# Altium footprint library 总库.PcbLib: 264 footprints (part 3 of 17)
Each footprint in its own frame and in the unit in brackets; x right, y up, seen from the top. Pads: shape width x height; smd on the part's side, far side on the other; paste and mask are expansions set on the pad; w line width, h text height; cw(c..) or ccw(c..) is an arc to the next point about the centre after c.
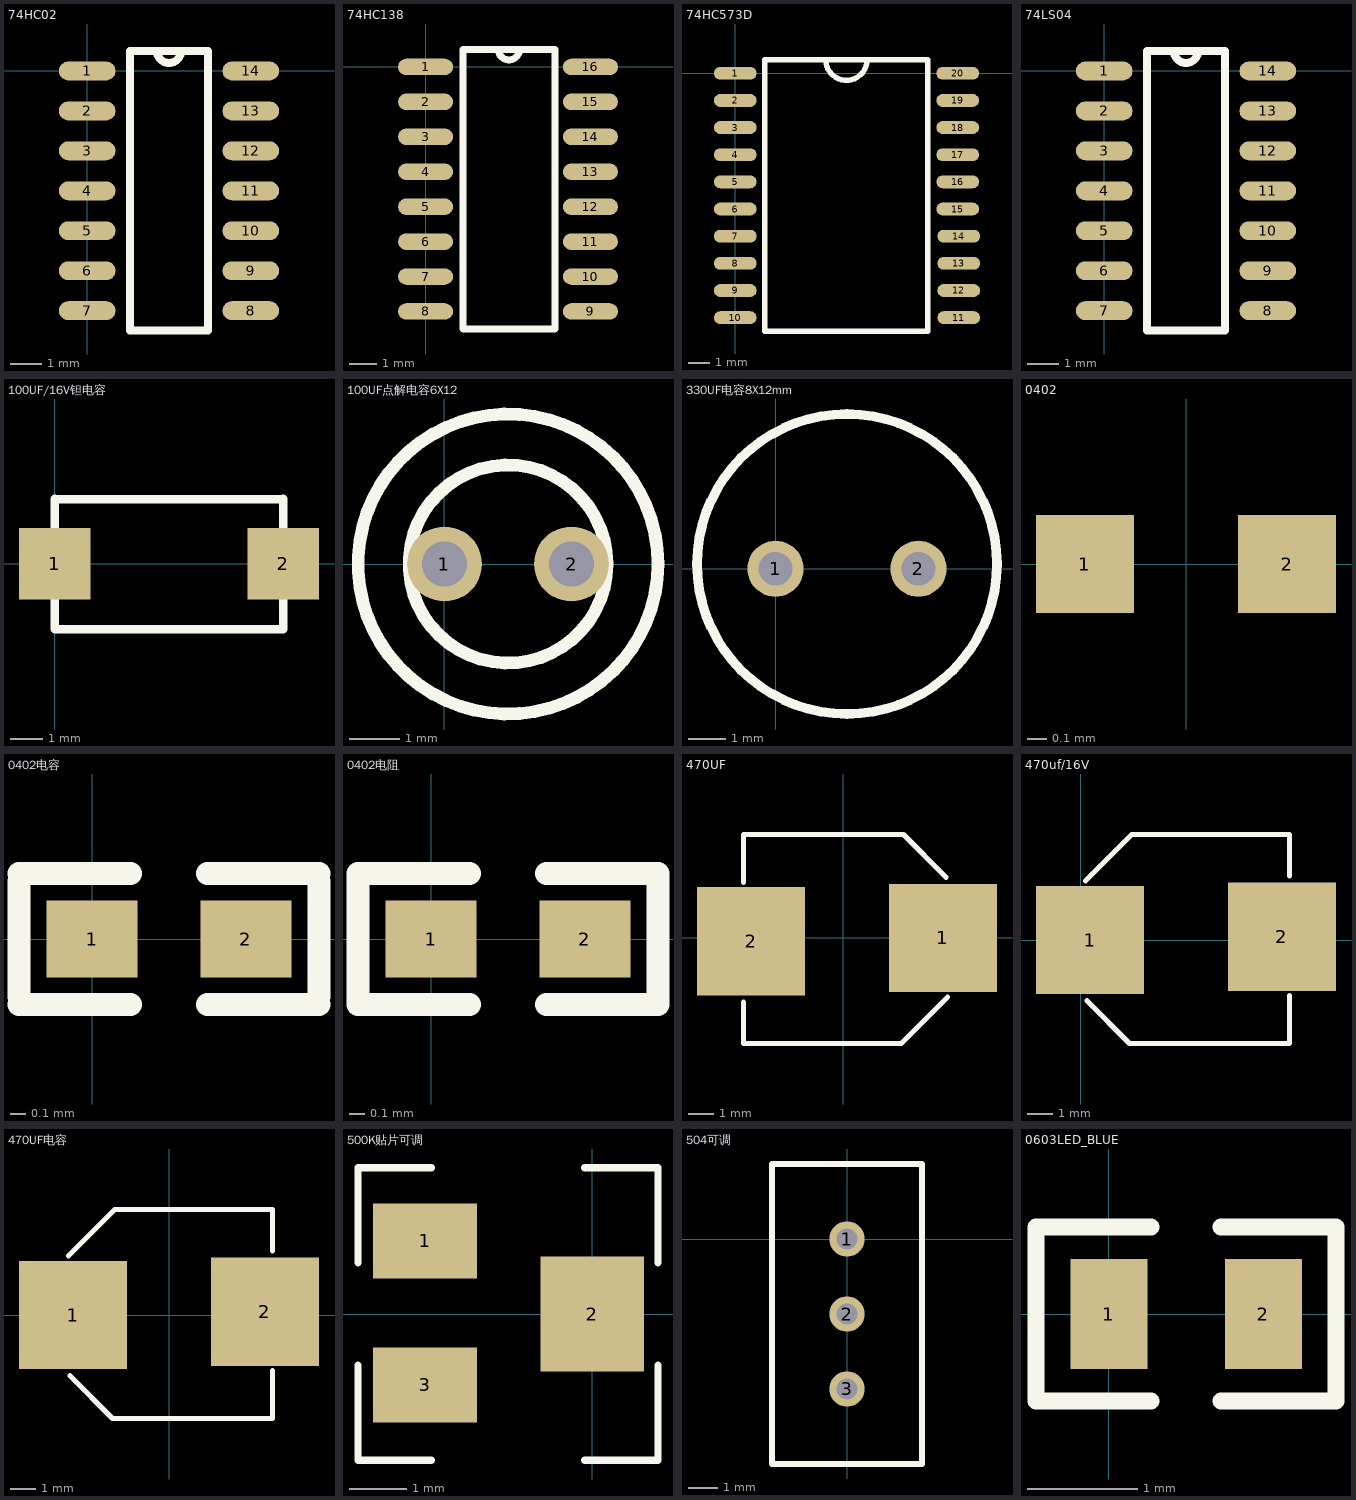
[diagram p2: the footprints below, top view; thin cyan lines are the x and y axes]

## 74HC02 [mm]
pads (14):
  oval 1.8x0.6 smd: 1(0,0) 2(0,-1.27) 3(0,-2.54) 4(0,-3.81) 5(0,-5.08) 6(0,-6.35) 7(0,-7.62) 8(5.2,-7.62) 9(5.2,-6.35) 10(5.2,-5.08) 11(5.2,-3.81) 12(5.2,-2.54) 13(5.2,-1.27) 14(5.2,0)
Top Overlay:
  lines w0.254: 2.219,0.635 ccw(c2.6,0.635) 2.981,0.635 ; 1.36,-8.255 3.84,-8.255 3.84,0.635 1.36,0.635 1.36,-8.255

## 74HC138 [mm]
pads (16):
  oval 2x0.6 smd: 1(0,0) 2(0,-1.27) 3(0,-2.54) 4(0,-3.81) 5(0,-5.08) 6(0,-6.35) 7(0,-7.62) 8(0,-8.89) 9(5.993,-8.89) 10(5.993,-7.62) 11(5.993,-6.35) 12(5.993,-5.08) 13(5.993,-3.81) 14(5.993,-2.54) 15(5.993,-1.27) 16(5.993,0)
Top Overlay:
  lines w0.254: 2.648,0.635 ccw(c3.029,0.635) 3.41,0.635 ; 1.36,-9.525 4.699,-9.525 4.699,0.635 1.36,0.635 1.36,-9.525

## 74HC573D [mm]
pads (20):
  oval 2x0.6 smd: 1(0,0) 2(0,-1.27) 3(0,-2.54) 4(0,-3.81) 5(0,-5.08) 6(0,-6.35) 7(0,-7.62) 8(0,-8.89) 9(0,-10.16) 10(0,-11.43) 11(10.455,-11.43) 12(10.455,-10.16) 13(10.455,-8.89) 14(10.455,-7.62) 15(10.406,-6.35) 16(10.406,-5.08) 17(10.406,-3.81) 18(10.406,-2.54) 19(10.406,-1.27) 20(10.406,0)
Top Overlay:
  lines w0.254: 4.233,0.635 ccw(c5.2,0.635) 6.167,0.635 ; 1.39,-12.065 1.39,0.635 9.01,0.635 9.01,-12.065 1.39,-12.065

## 74LS04 [mm]
pads (14):
  oval 1.8x0.6 smd: 1(0,0) 2(0,-1.27) 3(0,-2.54) 4(0,-3.81) 5(0,-5.08) 6(0,-6.35) 7(0,-7.62) 8(5.2,-7.62) 9(5.2,-6.35) 10(5.2,-5.08) 11(5.2,-3.81) 12(5.2,-2.54) 13(5.2,-1.27) 14(5.2,0)
Top Overlay:
  lines w0.254: 2.219,0.635 ccw(c2.6,0.635) 2.981,0.635 ; 1.36,-8.255 1.36,0.635 3.84,0.635 3.84,-8.255 1.36,-8.255

## 100UF/16V钽电容 [mm]
pads (2):
  rect 2.2x2.2 smd: 1(0,0) 2(7.01,0)
Top Overlay:
  lines w0.254: 0,1.981 7,1.981 ; 0,1.993 0,-2.007 7,-2.007 ; 7.01,-2.007 7.01,1.993
3D body: height 3.01, standoff 0, extent -0.195,-2.24 7.205,2.21

## 100UF点解电容6X12 [mm]
pads (2):
  round 1.5 hole 0.9: 1(0,0) 2(2.54,0)
Top Overlay:
  circle w0.254: c1.27,0 r1.981
  circle w0.254: c1.27,0 r3
3D body: height 12.6, standoff 0, extent -0.72,-1.99 3.26,1.99
3D body: height 12.5, standoff 0, extent -1.739,-3.009 4.279,3.009

## 330UF电容8X12mm [mm]
pads (2):
  round 1.5 hole 0.9: 1(0,0) 2(3.81,0)
Top Overlay:
  circle w0.254: c1.905,0.127 r4
3D body: height 14.4, standoff -2.9, extent -2.107,-3.885 6.093,4.315

## 0402 [mil]
pads (2):
  rect 20x20 smd: 1(-20.67,0) 2(20.67,0)
3D body: height 15.75, standoff 0, extent -20.67,-9.84 22.64,9.85

## 0402电容 [mm]
pads (2):
  rect 0.6x0.51 smd: 1(0,0) 2(1.016,0)
Top Overlay:
  lines w0.152: -0.483,-0.432 0.254,-0.432 ; -0.483,-0.381 -0.483,0.381 ; -0.483,0.432 0.254,0.432 ; 0.762,-0.432 1.499,-0.432 ; 0.762,0.432 1.499,0.432 ; 1.499,-0.381 1.499,0.381
3D body: height 0.51, standoff 0, extent -0.025,-0.254 0.991,0.254

## 0402电阻 [mm]
pads (2):
  rect 0.6x0.51 smd: 1(0,0) 2(1.016,0)
Top Overlay:
  lines w0.152: 0.254,-0.432 -0.483,-0.432 -0.483,-0.381 -0.483,0.381 -0.483,0.432 0.254,0.432 ; 0.762,-0.432 1.499,-0.432 1.499,-0.381 1.499,0.381 1.499,0.432 0.762,0.432
3D body: height 0.34, standoff 0, extent -0.012,-0.305 1.028,0.295

## 470UF [mm]
pads (2):
  rect 4.3x4.3 smd: 1(3.962,0) 2(-3.658,-0.127)
Top Overlay:
  lines w0.203: -3.957,-2.54 -3.957,-4.191 2.311,-4.191 4.153,-2.349 ; -3.957,2.204 -3.957,4.109 2.393,4.109 4.089,2.413
3D body: height 10.3, standoff -0.2, extent -5.002,-4.411 4.698,4.089

## 470uf/16V [mm]
pads (2):
  rect 4.3x4.3 smd: 1(0.381,0) 2(8.001,0.127)
Top Overlay:
  lines w0.203: 0.191,2.349 2.032,4.191 8.3,4.191 8.3,2.54 ; 0.254,-2.413 1.95,-4.109 8.3,-4.109 8.3,-2.204
3D body: height 10.3, standoff -0.2, extent -0.354,-4.089 9.346,4.411

## 470UF电容 [mm]
pads (2):
  rect 4.3x4.3 smd: 1(-3.81,0) 2(3.81,0.127)
Top Overlay:
  lines w0.203: -4,2.349 -2.159,4.191 4.109,4.191 4.109,2.54 ; -3.937,-2.413 -2.241,-4.109 4.109,-4.109 4.109,-2.204
3D body: height 10.3, standoff -0.2, extent -4.545,-4.089 5.155,4.411

## 500K贴片可调 [mm]
pads (3):
  rect 1.8x1.3 smd: 1(-2.9,1.27) 3(-2.9,-1.23)
  rect 1.8x2 smd: 2(0,0)
Top Overlay:
  lines w0.127: -4.064,-0.889 -4.064,-2.54 -2.794,-2.54 ; -4.064,0.889 -4.064,2.54 -2.794,2.54 ; -0.127,-2.54 1.143,-2.54 1.143,-0.889 ; -0.127,2.54 1.143,2.54 1.143,0.889
3D body: height 5.4, standoff 0, extent -1.326,-2.082 -0.084,-0.84
3D body: height 5.4, standoff 0, extent -1.698,-1.703 -0.456,-0.461
3D body: height 0, standoff 0, extent 0.255,-0.761 0.453,0.761
3D body: height 5.31, standoff 0, extent -1.709,-2.09 -0.069,-0.45
3D body: height 5.3, standoff 0, extent -3.245,-2.412 0.253,2.386
3D body: height 0.7, standoff 0, extent 0.255,-0.761 0.453,0.761
3D body: height 0.7, standoff 0, extent -3.445,0.763 -3.247,1.777
3D body: height 0.7, standoff 0, extent -3.445,-1.777 -3.247,-0.763

## 504可调 [mm]
pads (3):
  round 1.2 hole 0.7: 1(0,0) 2(0,-2.54) 3(0,-5.08)
Top Overlay:
  lines w0.203: -2.54,-7.62 -2.54,2.54 2.54,2.54 2.54,-7.62 -2.54,-7.62
3D body: height 12.18, standoff -4.09, extent -2.41,-7.465 2.54,2.335

## 0603LED_BLUE [mm]
pads (2):
  rect 0.7x1 smd: 1(0,0) 2(1.4,0)
Top Overlay:
  lines w0.152: 0.381,-0.787 -0.66,-0.787 -0.66,0.787 0.381,0.787 ; 1.016,-0.787 2.057,-0.787 2.057,0.787 1.016,0.787
3D body: height -0.38, standoff -1.28, extent -0.139,-0.432 1.561,0.468